# Altium footprint library TeCrea-Misc.PCBLIB: 105 footprints (part 3 of 7)
Each footprint in its own frame and in the unit in brackets; x right, y up, seen from the top. Pads: shape width x height; smd on the part's side, far side on the other; paste and mask are expansions set on the pad; w line width, h text height; cw(c..) or ccw(c..) is an arc to the next point about the centre after c.
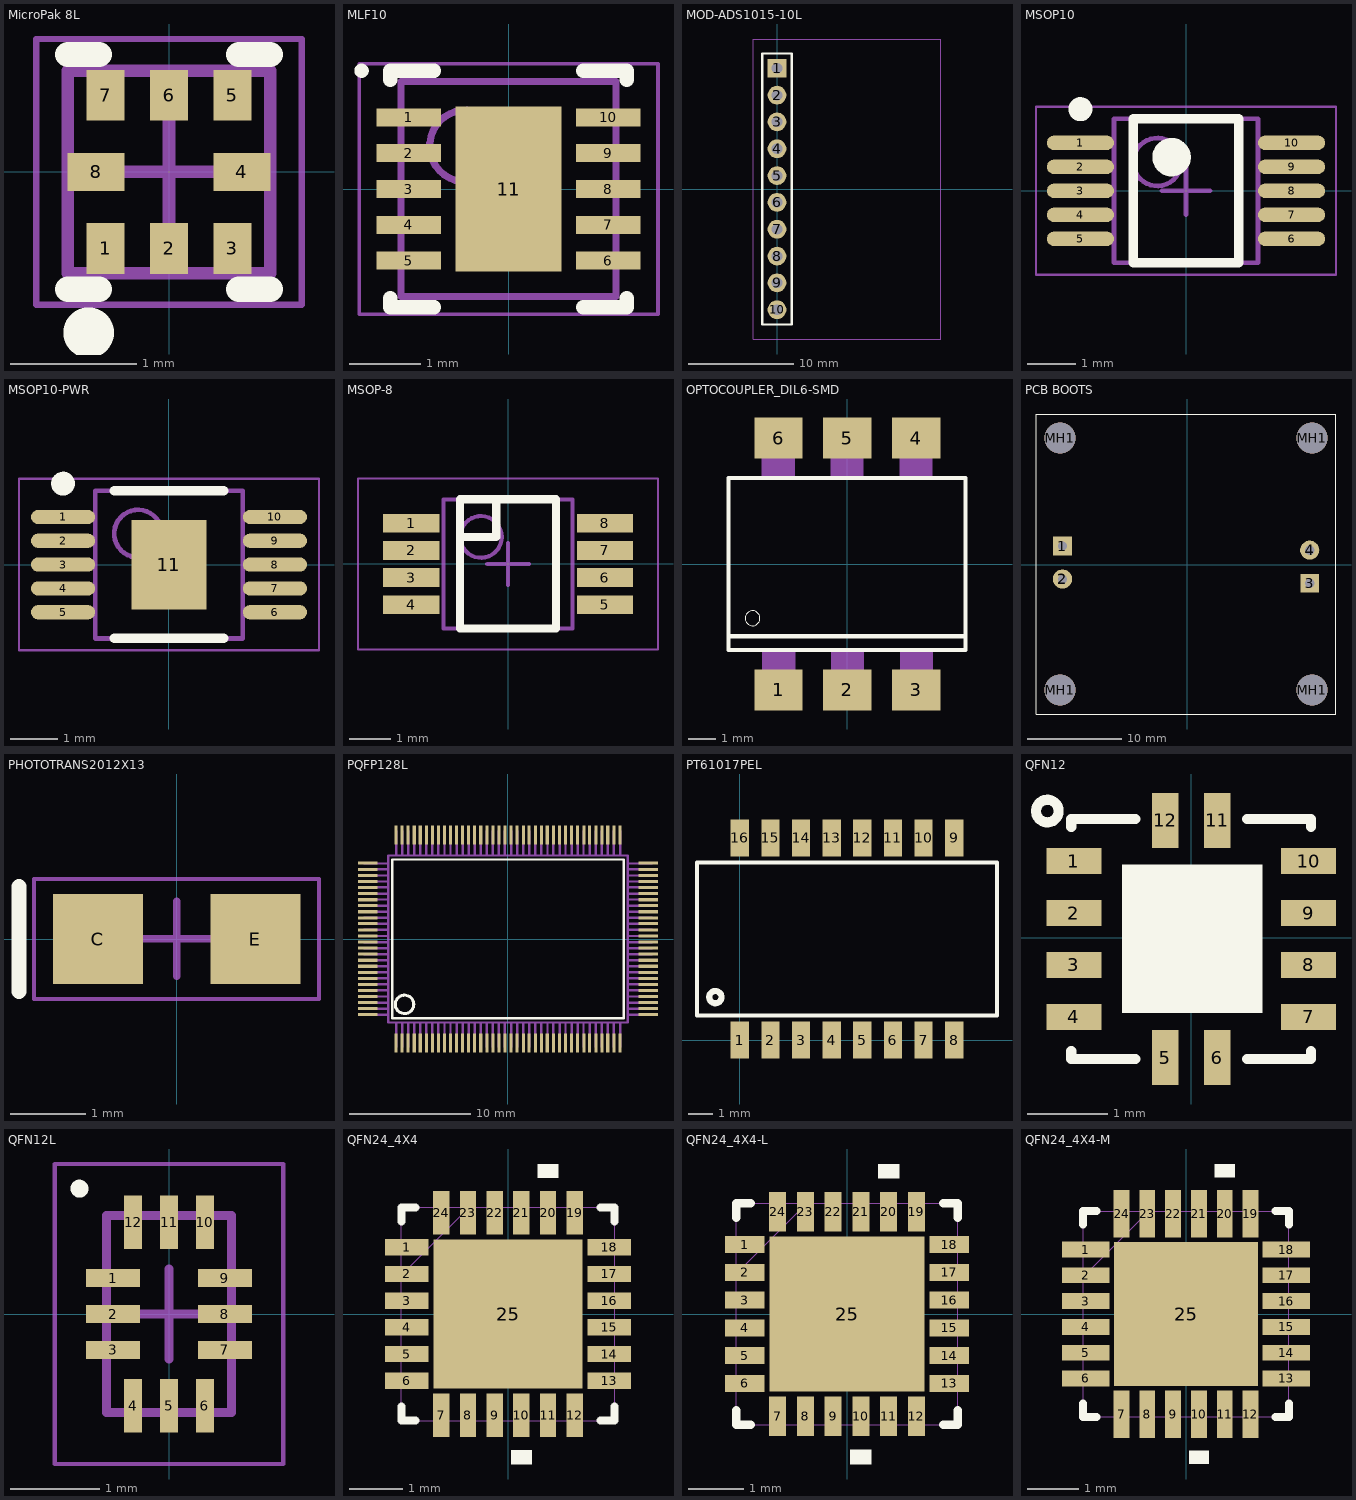
[diagram p2: the footprints below, top view; thin cyan lines are the x and y axes]

## MicroPak 8L [mm]
pads (8):
  rect 0.3x0.4 smd: 1(-0.5,-0.605) 2(0,-0.605) 3(0.5,-0.605) 5(0.5,0.605) 6(0,0.605) 7(-0.5,0.605)
  rect 0.45x0.3 smd: 4(0.575,0) 8(-0.575,0)
Top Overlay:
  circle w0.3: c-0.635,-1.27 r0.05
  lines w0.2: -0.8,-0.927 -0.55,-0.927 ; -0.8,0.927 -0.55,0.927 ; 0.55,-0.927 0.8,-0.927 ; 0.55,0.927 0.8,0.927
Mechanical 13:
  lines w0.1: -0.8,-0.8 -0.8,0.8 0.8,0.8 0.8,-0.8 -0.8,-0.8
Mechanical 15:
  lines w0.05: -1.05,-1.05 -1.05,1.05 1.05,1.05 1.05,-1.05 -1.05,-1.05
  lines w0.1: -0.5,0 0.5,0 ; 0,-0.5 0,0.5
3D body: height 0.5, standoff 0.05, extent -0.8,-0.8 0.8,0.8

## MLF10 [mm] "MLF, 10-Leads, Body 3.00x3.00mm, Pitch 0.50mm, Thermal Pad 2.30x1.48mm, IPC Medium Density"
height 1
pads (11):
  rect 0.9x0.25 smd: 1(-1.39,1) 2(-1.39,0.5) 3(-1.39,0) 4(-1.39,-0.5) 5(-1.39,-1) 6(1.39,-1) 7(1.39,-0.5) 8(1.39,0) 9(1.39,0.5) 10(1.39,1)
  rect 1.48x2.3 smd: 11(0,0)
Top Overlay:
  circle w0.1: c-2.05,1.65 r0.05
  lines w0.2: -1.65,-1.525 -1.65,-1.65 -1.04,-1.65 ; -1.65,1.525 -1.65,1.65 -1.04,1.65 ; 1.04,-1.65 1.65,-1.65 1.65,-1.525 ; 1.04,1.65 1.65,1.65 1.65,1.525
Mechanical 13:
  circle w0.1: c-0.6,0.6 r0.5
  lines w0.1: -1.5,-1.5 -1.5,1.5 1.5,1.5 1.5,-1.5 -1.5,-1.5
Mechanical 15:
  lines w0.05: -2.085,-1.75 -2.085,1.75 2.085,1.75 2.085,-1.75 -2.085,-1.75
  lines w0.1: -0.5,0 0.5,0 ; 0,-0.5 0,0.5
3D body "MLF10.step": height 1, standoff 0, extent -1.55,-1.5 1.55,1.5

## MOD-ADS1015-10L [mil]
pads (10):
  rect 70x70 hole 39.37: 1(0,450)
  round 70 hole 39.37: 2(0,350) 3(0,250) 4(0,150) 5(0,50) 6(0,-50) 7(0,-150) 8(0,-250) 9(0,-350) 10(0,-450)
Top Overlay:
  lines w7.87: -55,-505 55,-505 55,505 -55,505 -55,-505
Mechanical 15:
  lines w1.97: -88.58,-559.06 -88.58,559.06 610.24,559.06 610.24,-559.06 -88.58,-559.06
3D body "1x10x2.54 Pin Header TH  V.STEP": height 336.42, standoff -117.91, extent -50,-500 50,500
3D body "16Bit I2C ADC+PGA - ADS1115.stp": height 210.24, standoff 102.36, extent -78.74,-550 601.26,550

## MSOP10 [mm] "TSSOP, 10-Leads, Body 3,00x3,00mm, Pitch 0,50mm, IPC Medium Density"
height 1.1
pads (10):
  oval 1.4x0.3 smd: 1(-2.2,1) 2(-2.2,0.5) 3(-2.2,0) 4(-2.2,-0.5) 5(-2.2,-1) 6(2.2,-1) 7(2.2,-0.5) 8(2.2,0) 9(2.2,0.5) 10(2.2,1)
Top Overlay:
  circle w0.4: c-0.3,0.7 r0.2
  circle w0.25: c-2.2,1.7 r0.125
  lines w0.2: -1.1,-1.5 1.1,-1.5 1.1,1.5 -1.1,1.5 -1.1,-1.5
Courtyard Top:
  lines w0.05: -3.125,-1.75 3.125,-1.75 3.125,1.75 -3.125,1.75 -3.125,-1.75
  lines w0.1: -0.5,0 0.5,0 ; 0,-0.5 0,0.5
Assembly Top:
  circle w0.1: c-0.6,0.6 r0.5
  lines w0.1: -1.5,-1.5 1.5,-1.5 1.5,1.5 -1.5,1.5 -1.5,-1.5
3D body "TSSOP50P490X110-10N.step": height 1.1, standoff 0, extent -2.45,-1.5 2.45,1.5

## MSOP10-PWR [mm]
height 1.1
pads (11):
  oval 1.35x0.3 smd: 1(-2.225,1) 2(-2.225,0.5) 3(-2.225,0) 4(-2.225,-0.5) 5(-2.225,-1) 6(2.225,-1) 7(2.225,-0.5) 8(2.225,0) 9(2.225,0.5) 10(2.225,1)
  rect 1.57x1.88 smd: 11(0,0)
Top Overlay:
  circle w0.25: c-2.225,1.7 r0.125
  lines w0.2: -1.15,-1.55 1.15,-1.55 ; -1.15,1.55 1.15,1.55
Courtyard Top:
  lines w0.05: -3.15,-1.8 -3.15,1.8 3.15,1.8 3.15,-1.8 -3.15,-1.8
  lines w0.1: -0.5,0 0.5,0 ; 0,-0.5 0,0.5
Assembly Top:
  circle w0.1: c-0.65,0.65 r0.5
  lines w0.1: -1.55,-1.55 -1.55,1.55 1.55,1.55 1.55,-1.55 -1.55,-1.55
3D body "MSOP10-PWR.step": height 1.1, standoff 0, extent -2.45,-1.55 2.45,1.55

## MSOP-8 [mm]
height 1.1
pads (8):
  rect 1.35x0.45 smd: 1(-2.325,0.975) 2(-2.325,0.325) 3(-2.325,-0.325) 4(-2.325,-0.975) 5(2.325,-0.975) 6(2.325,-0.325) 7(2.325,0.325) 8(2.325,0.975)
Top Overlay:
  lines w0.2: -1.15,0.65 -0.279,0.65 -0.279,1.55 -0.5,1.55 ; -1.15,-1.55 -1.15,1.55 1.15,1.55 1.15,-1.55 -1.15,-1.55
Courtyard Top:
  lines w0.05: -3.6,-2.05 -3.6,2.05 3.6,2.05 3.6,-2.05 -3.6,-2.05
  lines w0.1: -0.5,0 0.5,0 ; 0,-0.5 0,0.5
Assembly Top:
  circle w0.1: c-0.65,0.65 r0.5
  lines w0.1: -1.55,-1.55 -1.55,1.55 1.55,1.55 1.55,-1.55 -1.55,-1.55
3D body "MSOP-8.step": height 1.1, standoff 0, extent -2.45,-1.55 2.45,1.55

## OPTOCOUPLER_DIL6-SMD [mm]
pads (6):
  rect 1.78x1.52 smd: 1(-2.54,-4.645) 2(0,-4.645) 3(2.54,-4.645) 4(2.54,4.645) 5(0,4.645) 6(-2.54,4.645)
Top Overlay:
  circle w0: c-3.5,-2 r0.276
  lines w0.152: -4.285,-2.664 4.36,-2.664 ; 4.36,-2.664 4.36,-3.18 -4.385,-3.18 -4.385,3.18 4.36,3.18 4.36,-2.664
Mechanical 16:
  region: -1.935,4.95 -3.16,4.95 -3.16,3.2 -1.935,3.2
  region: 0.605,4.95 -0.62,4.95 -0.62,3.2 0.605,3.2
  region: 3.145,4.95 1.92,4.95 1.92,3.2 3.145,3.2
  rectangle: 1.935,-4.95 3.16,-3.2
  rectangle: -0.605,-4.95 0.62,-3.2
  rectangle: -3.145,-4.95 -1.92,-3.2

## PCB BOOTS [mil]
pads (8):
  rect 77.46x77.46 / inner rect 60x60 / far side rect 77.46x77.46 hole 39.37: 1(-520.41,79.08) 3(509.59,-75.92)
  round 80 / inner round 60 / far side round 80 hole 39.37: 2(-520.41,-58.72) 4(509.59,61.88)
  round 130 hole 130 unplated: MH1(-530.41,-520.92) MH1(-530.41,529.08) MH1(519.59,-520.92) MH1(519.59,529.08)
Top Overlay:
  lines w5: -630.41,-620.92 -630.41,629.08 618.8,629.08 618.8,-620.92 -630.41,-620.92
3D body "SparkFun_Buck-Boost.step": height 157.48, standoff 94.48, extent -630,-623 620,627
3D body "HTSW-101-07-T-S.stp": height 330.5, standoff -99.5, extent -568,-106 -470,-6
3D body "HTSW-101-07-T-S.stp": height 330.5, standoff -99.5, extent -569.41,29.09 -471.41,129.09
3D body "HTSW-101-07-T-S.stp": height 330.5, standoff -99.5, extent 460,10 558,110
3D body "HTSW-101-07-T-S.stp": height 330.5, standoff -99.5, extent 459.59,-124.92 559.59,-26.92

## PHOTOTRANS2012X13 [mm]
pads (2):
  rect 1.2x1.2 smd: C(-1.05,0) E(1.05,0)
Top Overlay:
  lines w0.2: -2.1,-0.7 -2.1,0.7
Mechanical 15:
  lines w0.05: -1.9,-0.8 -1.9,0.8 1.9,0.8 1.9,-0.8 -1.9,-0.8
  lines w0.1: -0.5,0 0.5,0 ; 0,-0.5 0,0.5
3D body: height 0.61, standoff 0.01, extent -1,-0.625 1,0.625
3D body: height 1.3, standoff 0.61, extent -0.7,-0.625 0.7,0.625

## PQFP128L [mil]
pads (128):
  rect 10x63 smd: 1(-364.17,-338.58) 2(-344.49,-338.58) 3(-324.8,-338.58) 4(-305.12,-338.58) 5(-285.43,-338.58) 6(-265.75,-338.58) 7(-246.06,-338.58) 8(-226.38,-338.58) 9(-206.69,-338.58) 10(-187.01,-338.58) 11(-167.32,-338.58) 12(-147.64,-338.58) 13(-127.95,-338.58) 14(-108.27,-338.58) 15(-88.58,-338.58) 16(-68.9,-338.58) 17(-49.21,-338.58) 18(-29.53,-338.58) 19(-9.84,-338.58) 20(10,-338.58) 21(30,-338.58) 22(50,-338.58) 23(69,-338.58) 24(89,-338.58) 25(109,-338.58) 26(128,-338.58) 27(148,-338.58) 28(168,-338.58) 29(188,-338.58) 30(207,-338.58) 31(227,-338.58) 32(247,-338.58) 33(266,-338.58) 34(286,-338.58) 35(306,-338.58) 36(325,-338.58) 37(345,-338.58) 38(365,-338.58) 65(365,339) 66(345,339) 67(325,339) 68(306,339) 69(286,339) 70(266,339) 71(247,339) 72(227,339) 73(207,339) 74(188,339) 75(168,339) 76(148,339) 77(128,339) 78(109,339) 79(89,339) 80(69,339) 81(50,339) 82(30,339) 83(10,339) 84(-9.84,339) 85(-29.53,339) 86(-49.21,339) 87(-68.9,339) 88(-88.58,339) 89(-108.27,339) 90(-127.95,339) 91(-147.64,339) 92(-167.32,339) 93(-187.01,339) 94(-206.69,339) 95(-226.38,339) 96(-246.06,339) 97(-265.75,339) 98(-285.43,339) 99(-305.12,339) 100(-324.8,339) 101(-344.49,339) 102(-364.17,339)
  rect 63x10 smd: 39(457,-246.06) 40(457,-226.38) 41(457,-206.69) 42(457,-187.01) 43(457,-167.32) 44(457,-147.64) 45(457,-127.95) 46(457,-108.27) 47(457,-88.58) 48(457,-68.9) 49(457,-49.21) 50(457,-29.53) 51(457,-9.84) 52(457,10) 53(457,30) 54(457,50) 55(457,69) 56(457,89) 57(457,109) 58(457,128) 59(457,148) 60(457,168) 61(457,188) 62(457,207) 63(457,227) 64(457,247) 103(-456.69,247) 104(-456.69,227) 105(-456.69,207) 106(-456.69,188) 107(-456.69,168) 108(-456.69,148) 109(-456.69,128) 110(-456.69,109) 111(-456.69,89) 112(-456.69,69) 113(-456.69,50) 114(-456.69,30) 115(-456.69,10) 116(-456.69,-9.84) 117(-456.69,-29.53) 118(-456.69,-49.21) 119(-456.69,-68.9) 120(-456.69,-88.58) 121(-456.69,-108.27) 122(-456.69,-127.95) 123(-456.69,-147.64) 124(-456.69,-167.32) 125(-456.69,-187.01) 126(-456.69,-206.69) 127(-456.69,-226.38) 128(-456.69,-246.06)
Top Overlay:
  circle w10: c-336.61,-212.6 r30
  lines w8: -376.77,-258.27 377,-258.27 377,259 -376.77,259 -376.77,-258.27
Mechanical 16:
  rectangle: -368.11,-352.36 -360.24,-273.62
  rectangle: -348.43,-352.36 -340.55,-273.62
  rectangle: -328.74,-352.36 -320.87,-273.62
  rectangle: -309.06,-352.36 -301.18,-273.62
  rectangle: -289.37,-352.36 -281.5,-273.62
  rectangle: -269.69,-352.36 -261.81,-273.62
  rectangle: -250,-352.36 -242.13,-273.62
  rectangle: -230.31,-352.36 -222.44,-273.62
  rectangle: -210.63,-352.36 -202.76,-273.62
  rectangle: -190.94,-352.36 -183.07,-273.62
  rectangle: -171.26,-352.36 -163.39,-273.62
  rectangle: -151.57,-352.36 -143.7,-273.62
  rectangle: -131.89,-352.36 -124.02,-273.62
  rectangle: -112.2,-352.36 -104.33,-273.62
  rectangle: -92.52,-352.36 -84.65,-273.62
  rectangle: -72.83,-352.36 -64.96,-273.62
  rectangle: -53.15,-352.36 -45.28,-273.62
  rectangle: -33.46,-352.36 -25.59,-273.62
  rectangle: -13.78,-352.36 -5.91,-273.62
  rectangle: 6,-352.36 14,-273.62
  rectangle: 26,-352.36 34,-273.62
  rectangle: 46,-352.36 54,-273.62
  rectangle: 65,-352.36 73,-273.62
  rectangle: 85,-352.36 93,-273.62
  rectangle: 105,-352.36 113,-273.62
  rectangle: 125,-352.36 132,-273.62
  rectangle: 144,-352.36 152,-273.62
  rectangle: 164,-352.36 172,-273.62
  rectangle: 184,-352.36 191,-273.62
  rectangle: 203,-352.36 211,-273.62
  rectangle: 223,-352.36 231,-273.62
  rectangle: 243,-352.36 250,-273.62
  rectangle: 262,-352.36 270,-273.62
  rectangle: 282,-352.36 290,-273.62
  rectangle: 302,-352.36 310,-273.62
  rectangle: 321,-352.36 329,-273.62
  rectangle: 341,-352.36 349,-273.62
  rectangle: 361,-352.36 369,-273.62
  rectangle: 392,-250 471,-242.13
  rectangle: 392,-230.31 471,-222.44
  rectangle: 392,-210.63 471,-202.76
  rectangle: 392,-190.94 471,-183.07
  rectangle: 392,-171.26 471,-163.39
  rectangle: 392,-151.57 471,-143.7
  rectangle: 392,-131.89 471,-124.02
  rectangle: 392,-112.2 471,-104.33
  rectangle: 392,-92.52 471,-84.65
  rectangle: 392,-72.83 471,-64.96
  rectangle: 392,-53.15 471,-45.28
  rectangle: 392,-33.46 471,-25.59
  rectangle: 392,-13.78 471,-5.91
  rectangle: 392,6 471,14
  rectangle: 392,26 471,34
  rectangle: 392,46 471,54
  rectangle: 392,65 471,73
  rectangle: 392,85 471,93
  rectangle: 392,105 471,113
  rectangle: 392,125 471,132
  rectangle: 392,144 471,152
  rectangle: 392,164 471,172
  rectangle: 392,184 471,191
  rectangle: 392,203 471,211
  rectangle: 392,223 471,231
  rectangle: 392,243 471,250
  rectangle: 361,274 369,353
  rectangle: 341,274 349,353
  rectangle: 321,274 329,353
  rectangle: 302,274 310,353
  rectangle: 282,274 290,353
  rectangle: 262,274 270,353
  rectangle: 243,274 250,353
  rectangle: 223,274 231,353
  rectangle: 203,274 211,353
  rectangle: 184,274 191,353
  rectangle: 164,274 172,353
  rectangle: 144,274 152,353
  rectangle: 125,274 132,353
  rectangle: 105,274 113,353
  rectangle: 85,274 93,353
  rectangle: 65,274 73,353
  rectangle: 46,274 54,353
  rectangle: 26,274 34,353
  rectangle: 6,274 14,353
  rectangle: -13.78,274 -5.91,353
  rectangle: -33.46,274 -25.59,353
  rectangle: -53.15,274 -45.28,353
  rectangle: -72.83,274 -64.96,353
  rectangle: -92.52,274 -84.65,353
  rectangle: -112.2,274 -104.33,353
  rectangle: -131.89,274 -124.02,353
  rectangle: -151.57,274 -143.7,353
  rectangle: -171.26,274 -163.39,353
  rectangle: -190.94,274 -183.07,353
  rectangle: -210.63,274 -202.76,353
  rectangle: -230.31,274 -222.44,353
  rectangle: -250,274 -242.13,353
  rectangle: -269.69,274 -261.81,353
  rectangle: -289.37,274 -281.5,353
  rectangle: -309.06,274 -301.18,353
  rectangle: -328.74,274 -320.87,353
  rectangle: -348.43,274 -340.55,353
  rectangle: -368.11,274 -360.24,353
  rectangle: -470.47,243 -391.73,250
  rectangle: -470.47,223 -391.73,231
  rectangle: -470.47,203 -391.73,211
  rectangle: -470.47,184 -391.73,191
  rectangle: -470.47,164 -391.73,172
  rectangle: -470.47,144 -391.73,152
  rectangle: -470.47,125 -391.73,132
  rectangle: -470.47,105 -391.73,113
  rectangle: -470.47,85 -391.73,93
  rectangle: -470.47,65 -391.73,73
  rectangle: -470.47,46 -391.73,54
  rectangle: -470.47,26 -391.73,34
  rectangle: -470.47,6 -391.73,14
  rectangle: -470.47,-13.78 -391.73,-5.91
  rectangle: -470.47,-33.46 -391.73,-25.59
  rectangle: -470.47,-53.15 -391.73,-45.28
  rectangle: -470.47,-72.83 -391.73,-64.96
  rectangle: -470.47,-92.52 -391.73,-84.65
  rectangle: -470.47,-112.2 -391.73,-104.33
  rectangle: -470.47,-131.89 -391.73,-124.02
  rectangle: -470.47,-151.57 -391.73,-143.7
  rectangle: -470.47,-171.26 -391.73,-163.39
  rectangle: -470.47,-190.94 -391.73,-183.07
  rectangle: -470.47,-210.63 -391.73,-202.76
  rectangle: -470.47,-230.31 -391.73,-222.44
  rectangle: -470.47,-250 -391.73,-242.13
  lines w8: -389.76,-271.65 390,-271.65 390,272 -389.76,272 -389.76,-271.65
3D body "User Library-LQFP-144-1.STEP": height 60.5, standoff -0.52, extent -433.3,-314.28 441.3,324

## PT61017PEL [mil]
pads (16):
  rect 29.92x60 smd: 1(0,0) 2(50,0) 3(100,0) 4(150,0) 5(200,0) 6(250,0) 7(300,0) 8(350,0) 9(350,330) 10(300,330) 11(250,330) 12(200,330) 13(150,330) 14(100,330) 15(50,330) 16(0,330)
Top Overlay:
  circle w10: c-40,70 r10
  lines w5.91: -70,40 -70,290 420,290 420,40 -70,40
3D body "PT61017PEL.step": height 199.94, standoff -10.12, extent -78,-12 425.3,338.02

## QFN12 [mm]
pads (12):
  rect 0.686x0.33 smd: 1(-1.467,0.96) 2(-1.467,0.31) 3(-1.467,-0.34) 4(-1.467,-0.99) 7(1.468,-0.99) 8(1.468,-0.34) 9(1.468,0.31) 10(1.468,0.96)
  rect 0.33x0.686 smd: 5(-0.325,-1.498) 6(0.325,-1.498) 11(0.325,1.468) 12(-0.325,1.468)
Top Overlay:
  circle w0.127: c-1.8,1.585 r0.141
  rectangle: -0.864,-0.94 0.889,0.914
  lines w0.127: -1.5,-1.415 -1.5,-1.515 -0.7,-1.515 ; -1.5,1.385 -1.5,1.485 -0.7,1.485 ; 0.7,-1.515 1.5,-1.515 1.5,-1.415 ; 0.7,1.485 1.5,1.485 1.5,1.385
3D body: height 1.01, standoff 0, extent -1.214,0.917 -0.914,1.217
3D body: height 1, standoff 0, extent -1.499,-1.524 1.499,1.448

## QFN12L [mm] "QFN, 12-Leads, Body 1,40x2,20mm, Pitch 0,40mm, IPC Medium Density"
height 0.55
pads (12):
  rect 0.6x0.2 smd: 1(-0.625,0.4) 2(-0.625,0) 3(-0.625,-0.4) 7(0.625,-0.4) 8(0.625,0) 9(0.625,0.4)
  rect 0.2x0.6 smd: 4(-0.4,-1.025) 5(0,-1.025) 6(0.4,-1.025) 10(0.4,1.025) 11(0,1.025) 12(-0.4,1.025)
Top Overlay:
  circle w0.1: c-1,1.4 r0.05
Courtyard Top:
  lines w0.05: -1.275,-1.675 1.275,-1.675 1.275,1.675 -1.275,1.675 -1.275,-1.675
  lines w0.1: -0.5,0 0.5,0 ; 0,-0.5 0,0.5
Assembly Top:
  lines w0.1: -0.7,-1.1 0.7,-1.1 0.7,1.1 -0.7,1.1 -0.7,-1.1
3D body "QFN12L.step": height 0.55, standoff 0, extent -0.72,-1.12 0.72,1.12

## QFN24_4X4 [mil]
pads (25):
  rect 32x12 smd mask+5: 1(-74.5,49.21) 2(-74.5,29.53) 3(-74.5,9.84) 4(-74.5,-9.84) 5(-74.5,-29.53) 6(-74.5,-49.21) 13(74.5,-49.21) 14(74.5,-29.53) 15(74.5,-9.84) 16(74.5,9.84) 17(74.5,29.53) 18(74.5,49.21)
  rect 12x32 smd mask+5: 7(-49.21,-74.5) 8(-29.53,-74.5) 9(-9.84,-74.5) 10(9.84,-74.5) 11(29.53,-74.5) 12(49.21,-74.5) 19(49.21,74.5) 20(29.53,74.5) 21(9.84,74.5) 22(-9.84,74.5) 23(-29.53,74.5) 24(-49.21,74.5)
  rect 110x110 smd mask-54.5: 25(0,0)
Top Overlay:
  region: 37.03,100.5 22.03,100.5 22.03,110.5 37.03,110.5
  region: 17.34,-100.5 2.34,-100.5 2.34,-110.5 17.34,-110.5
  lines w6: -78.5,-68.21 -78.5,-78.5 -68.21,-78.5 ; -78.5,68.21 -78.5,78.5 -68.21,78.5 ; 68.21,-78.5 78.5,-78.5 78.5,-68.21 ; 68.21,78.5 78.5,78.5 78.5,68.21
Mechanical 1:
  lines w0: -78.5,28.5 -28.5,78.5 ; -78.5,-78.5 -78.5,78.5 78.5,78.5 78.5,-78.5 -78.5,-78.5 ; -78.5,-55.21 -78.5,-43.21 -78.5,-55.21 ; -78.5,-35.53 -78.5,-23.53 -78.5,-35.53 ; -78.5,-15.84 -78.5,-3.84 -78.5,-15.84 ; -78.5,3.84 -78.5,15.84 -78.5,3.84 ; -78.5,23.53 -78.5,35.53 -78.5,23.53 ; -78.5,43.21 -78.5,55.21 -78.5,43.21 ; -55.21,-78.5 -43.21,-78.5 -55.21,-78.5 ; -55.21,78.5 -43.21,78.5 -55.21,78.5 ; -35.53,-78.5 -23.53,-78.5 -35.53,-78.5 ; -35.53,78.5 -23.53,78.5 -35.53,78.5 ; -15.84,-78.5 -3.84,-78.5 -15.84,-78.5 ; -15.84,78.5 -3.84,78.5 -15.84,78.5 ; 3.84,-78.5 15.84,-78.5 3.84,-78.5 ; 3.84,78.5 15.84,78.5 3.84,78.5 ; 23.53,-78.5 35.53,-78.5 23.53,-78.5 ; 23.53,78.5 35.53,78.5 23.53,78.5 ; 43.21,-78.5 55.21,-78.5 43.21,-78.5 ; 43.21,78.5 55.21,78.5 43.21,78.5 ; 78.5,-55.21 78.5,-43.21 78.5,-55.21 ; 78.5,-35.53 78.5,-23.53 78.5,-35.53 ; 78.5,-15.84 78.5,-3.84 78.5,-15.84 ; 78.5,3.84 78.5,15.84 78.5,3.84 ; 78.5,23.53 78.5,35.53 78.5,23.53 ; 78.5,43.21 78.5,55.21 78.5,43.21
3D body "QFN24-4x4.step": height 35.43, standoff 0, extent -78.82,-78.81 78.81,78.83

## QFN24_4X4-L [mil]
pads (25):
  rect 28x12 smd mask+5: 1(-72.5,49.21) 2(-72.5,29.53) 3(-72.5,9.84) 4(-72.5,-9.84) 5(-72.5,-29.53) 6(-72.5,-49.21) 13(72.5,-49.21) 14(72.5,-29.53) 15(72.5,-9.84) 16(72.5,9.84) 17(72.5,29.53) 18(72.5,49.21)
  rect 12x28 smd mask+5: 7(-49.21,-72.5) 8(-29.53,-72.5) 9(-9.84,-72.5) 10(9.84,-72.5) 11(29.53,-72.5) 12(49.21,-72.5) 19(49.21,72.5) 20(29.53,72.5) 21(9.84,72.5) 22(-9.84,72.5) 23(-29.53,72.5) 24(-49.21,72.5)
  rect 110x110 smd mask-54.5: 25(0,0)
Top Overlay:
  region: 37.03,96.5 22.03,96.5 22.03,106.5 37.03,106.5
  region: 17.34,-96.5 2.34,-96.5 2.34,-106.5 17.34,-106.5
  lines w6: -78.5,-68.31 -78.5,-78.5 -68.31,-78.5 ; -78.5,68.31 -78.5,78.5 -68.31,78.5 ; 68.31,-78.5 78.5,-78.5 78.5,-68.31 ; 68.31,78.5 78.5,78.5 78.5,68.31
Mechanical 1:
  lines w0: -78.5,28.5 -28.5,78.5 ; -78.5,-78.5 -78.5,78.5 78.5,78.5 78.5,-78.5 -78.5,-78.5 ; -78.5,-55.21 -78.5,-43.21 -78.5,-55.21 ; -78.5,-35.53 -78.5,-23.53 -78.5,-35.53 ; -78.5,-15.84 -78.5,-3.84 -78.5,-15.84 ; -78.5,3.84 -78.5,15.84 -78.5,3.84 ; -78.5,23.53 -78.5,35.53 -78.5,23.53 ; -78.5,43.21 -78.5,55.21 -78.5,43.21 ; -55.21,-78.5 -43.21,-78.5 -55.21,-78.5 ; -55.21,78.5 -43.21,78.5 -55.21,78.5 ; -35.53,-78.5 -23.53,-78.5 -35.53,-78.5 ; -35.53,78.5 -23.53,78.5 -35.53,78.5 ; -15.84,-78.5 -3.84,-78.5 -15.84,-78.5 ; -15.84,78.5 -3.84,78.5 -15.84,78.5 ; 3.84,-78.5 15.84,-78.5 3.84,-78.5 ; 3.84,78.5 15.84,78.5 3.84,78.5 ; 23.53,-78.5 35.53,-78.5 23.53,-78.5 ; 23.53,78.5 35.53,78.5 23.53,78.5 ; 43.21,-78.5 55.21,-78.5 43.21,-78.5 ; 43.21,78.5 55.21,78.5 43.21,78.5 ; 78.5,-55.21 78.5,-43.21 78.5,-55.21 ; 78.5,-35.53 78.5,-23.53 78.5,-35.53 ; 78.5,-15.84 78.5,-3.84 78.5,-15.84 ; 78.5,3.84 78.5,15.84 78.5,3.84 ; 78.5,23.53 78.5,35.53 78.5,23.53 ; 78.5,43.21 78.5,55.21 78.5,43.21
3D body "QFN24-4x4.step": height 35.43, standoff 0, extent -78.82,-78.82 78.82,78.82

## QFN24_4X4-M [mil]
pads (25):
  rect 36x12 smd mask+5: 1(-76.5,49.21) 2(-76.5,29.53) 3(-76.5,9.84) 4(-76.5,-9.84) 5(-76.5,-29.53) 6(-76.5,-49.21) 13(76.5,-49.21) 14(76.5,-29.53) 15(76.5,-9.84) 16(76.5,9.84) 17(76.5,29.53) 18(76.5,49.21)
  rect 12x36 smd mask+5: 7(-49.21,-76.5) 8(-29.53,-76.5) 9(-9.84,-76.5) 10(9.84,-76.5) 11(29.53,-76.5) 12(49.21,-76.5) 19(49.21,76.5) 20(29.53,76.5) 21(9.84,76.5) 22(-9.84,76.5) 23(-29.53,76.5) 24(-49.21,76.5)
  rect 110x110 smd mask-54.5: 25(0,0)
Top Overlay:
  region: 17.34,-104.5 2.34,-104.5 2.34,-114.5 17.34,-114.5
  region: 37.03,104.5 22.03,104.5 22.03,114.5 37.03,114.5
  lines w6: -78.5,-68.31 -78.5,-78.5 -68.31,-78.5 ; -78.5,68.31 -78.5,78.5 -68.31,78.5 ; 68.31,-78.5 78.5,-78.5 78.5,-68.31 ; 68.31,78.5 78.5,78.5 78.5,68.31
Mechanical 1:
  lines w0: -78.5,28.5 -28.5,78.5 ; -78.5,-78.5 78.5,-78.5 78.5,78.5 -78.5,78.5 -78.5,-78.5 ; -78.5,-55.21 -78.5,-43.21 -78.5,-55.21 ; -78.5,-35.53 -78.5,-23.53 -78.5,-35.53 ; -78.5,-15.84 -78.5,-3.84 -78.5,-15.84 ; -78.5,3.84 -78.5,15.84 -78.5,3.84 ; -78.5,23.53 -78.5,35.53 -78.5,23.53 ; -78.5,43.21 -78.5,55.21 -78.5,43.21 ; -55.21,-78.5 -43.21,-78.5 -55.21,-78.5 ; -55.21,78.5 -43.21,78.5 -55.21,78.5 ; -35.53,-78.5 -23.53,-78.5 -35.53,-78.5 ; -35.53,78.5 -23.53,78.5 -35.53,78.5 ; -15.84,-78.5 -3.84,-78.5 -15.84,-78.5 ; -15.84,78.5 -3.84,78.5 -15.84,78.5 ; 3.84,-78.5 15.84,-78.5 3.84,-78.5 ; 3.84,78.5 15.84,78.5 3.84,78.5 ; 23.53,-78.5 35.53,-78.5 23.53,-78.5 ; 23.53,78.5 35.53,78.5 23.53,78.5 ; 43.21,-78.5 55.21,-78.5 43.21,-78.5 ; 43.21,78.5 55.21,78.5 43.21,78.5 ; 78.5,-55.21 78.5,-43.21 78.5,-55.21 ; 78.5,-35.53 78.5,-23.53 78.5,-35.53 ; 78.5,-15.84 78.5,-3.84 78.5,-15.84 ; 78.5,3.84 78.5,15.84 78.5,3.84 ; 78.5,23.53 78.5,35.53 78.5,23.53 ; 78.5,43.21 78.5,55.21 78.5,43.21
3D body "QFN24-4x4.step": height 35.43, standoff 0, extent -78.82,-78.81 78.82,78.83